# Altium footprint library LUMI_Handy_Soldering_LIB.PcbLib: 562 footprints (part 18 of 36)
Each footprint in its own frame and in the unit in brackets; x right, y up, seen from the top. Pads: shape width x height; smd on the part's side, far side on the other; paste and mask are expansions set on the pad; w line width, h text height; cw(c..) or ccw(c..) is an arc to the next point about the centre after c.
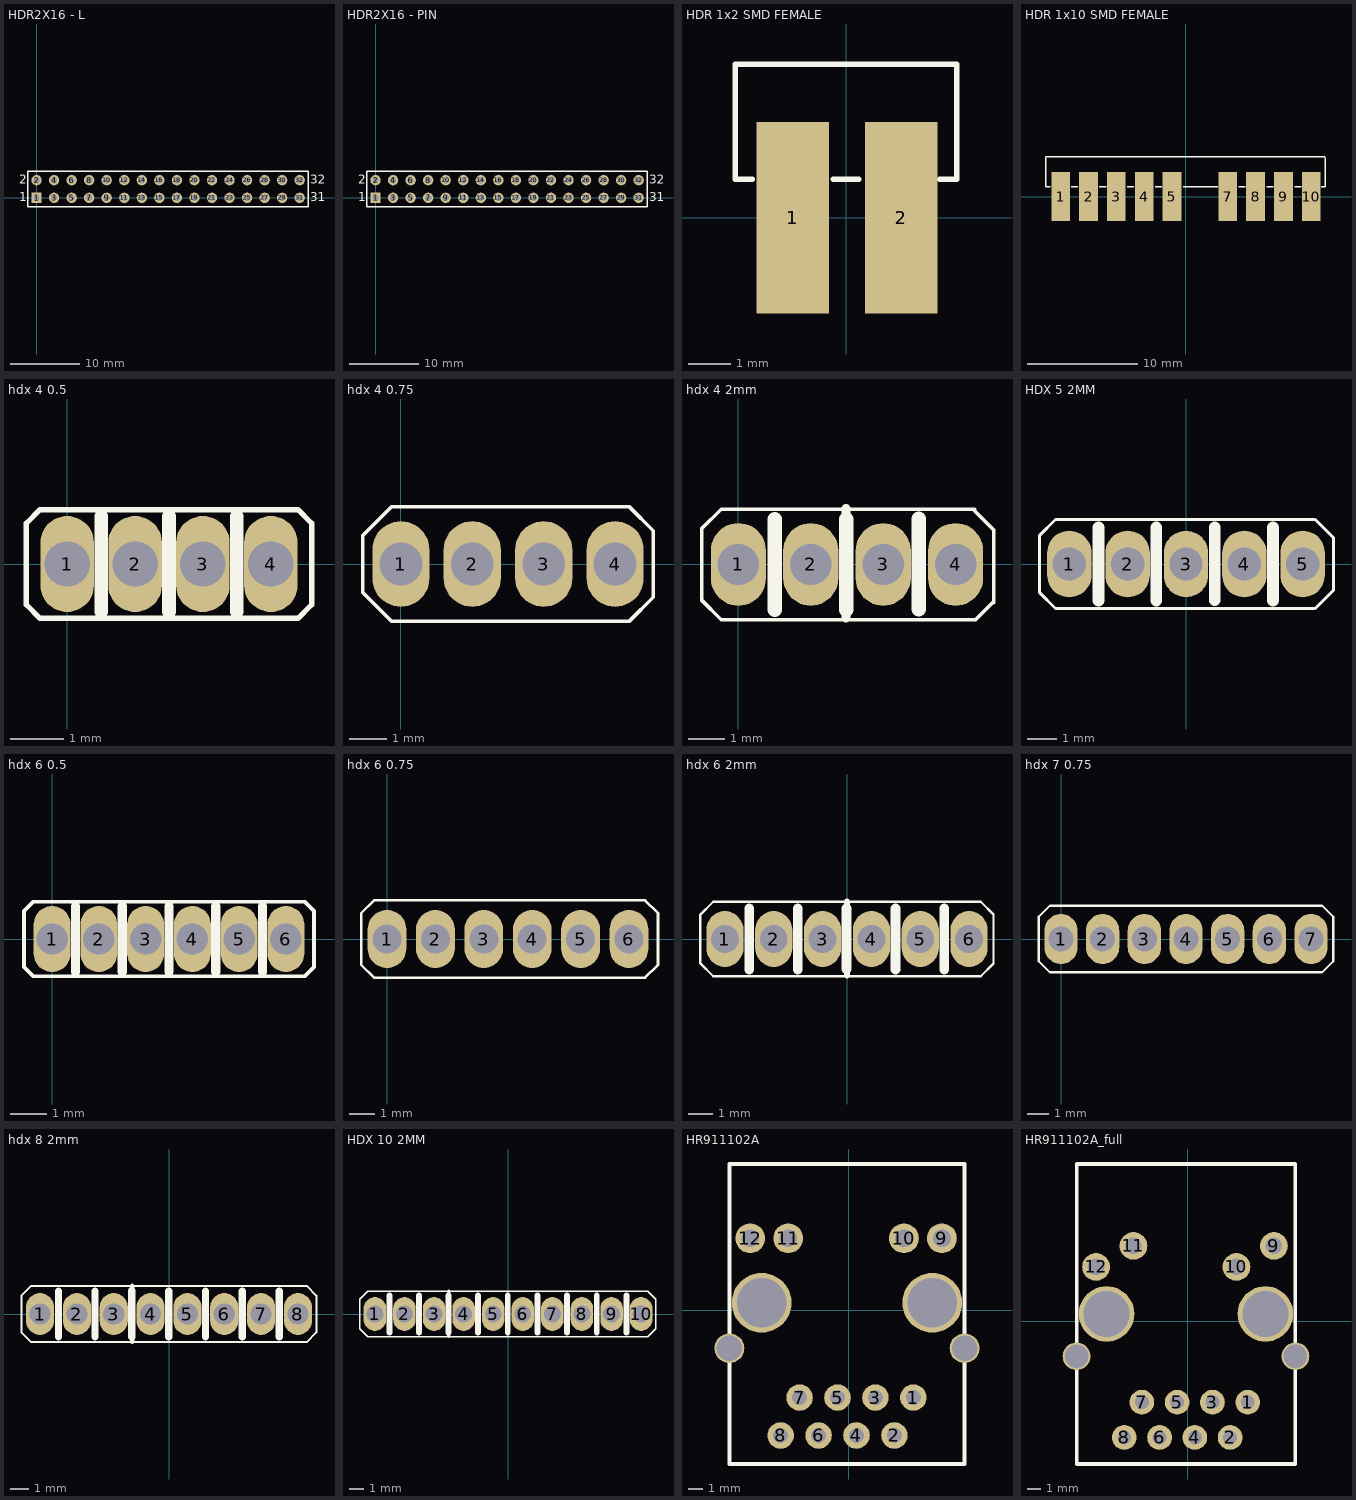
[diagram p17: the footprints below, top view; thin cyan lines are the x and y axes]

## HDR2X16 - L [mm] "Connector; Header; 16x2 Position"
pads (32):
  rect 1.5x1.5 hole 0.9: 1(0,0)
  round 1.5 hole 0.9: 2(0,2.54) 3(2.54,0) 4(2.54,2.54) 5(5.08,0) 6(5.08,2.54) 7(7.62,0) 8(7.62,2.54) 9(10.16,0) 10(10.16,2.54) 11(12.7,0) 12(12.7,2.54) 13(15.24,0) 14(15.24,2.54) 15(17.78,0) 16(17.78,2.54) 17(20.32,0) 18(20.32,2.54) 19(22.86,0) 20(22.86,2.54) 21(25.4,0) 22(25.4,2.54) 23(27.94,0) 24(27.94,2.54) 25(30.48,0) 26(30.48,2.54) 27(33.02,0) 28(33.02,2.54) 29(35.56,0) 30(35.56,2.54) 31(38.1,0) 32(38.1,2.54)
Top Overlay:
  lines w0.2: -1.27,-1.27 39.37,-1.27 39.37,3.81 -1.27,3.81 -1.27,-1.27
  text "2" at -2.54,2.032 h1.27
  text "1" at -2.54,-0.508 h1.27
  text "31" at 39.624,-0.508 h1.27
  text "32" at 39.624,2.032 h1.27
3D body: height 3.2, standoff -5.08, extent -1.118,-9.486 1.422,2.933
3D body: height 3.2, standoff -5.08, extent 1.372,-9.486 3.912,2.933
3D body: height 3.2, standoff -5.08, extent 3.912,-9.486 6.452,2.933
3D body: height 3.2, standoff -5.08, extent 6.452,-9.486 8.992,2.933
3D body: height 3.2, standoff -5.08, extent 8.992,-9.486 11.532,2.933
3D body: height 3.2, standoff -5.08, extent 11.506,-9.486 14.046,2.933
3D body: height 3.2, standoff -5.08, extent 14.021,-9.486 16.561,2.933
3D body: height 3.2, standoff -5.08, extent 16.561,-9.486 19.101,2.933
3D body: height 3.2, standoff -5.08, extent 19.101,-9.486 21.641,2.933
3D body: height 3.2, standoff -5.08, extent 21.615,-9.486 24.155,2.933
3D body: height 3.2, standoff -5.08, extent 24.155,-9.486 26.695,2.933
3D body: height 3.2, standoff -5.08, extent 26.695,-9.486 29.235,2.933
3D body: height 3.2, standoff -5.08, extent 29.185,-9.486 31.725,2.933
3D body: height 3.2, standoff -5.08, extent 31.674,-9.486 34.214,2.933
3D body: height 3.2, standoff -5.08, extent 34.163,-9.486 36.703,2.933
3D body: height 3.2, standoff -5.08, extent 36.678,-9.486 39.218,2.933

## HDR2X16 - PIN [mm] "Connector; Header; 16x2 Position"
pads (32):
  rect 1.5x1.5 hole 0.9: 1(0,0)
  round 1.5 hole 0.9: 2(0,2.54) 3(2.54,0) 4(2.54,2.54) 5(5.08,0) 6(5.08,2.54) 7(7.62,0) 8(7.62,2.54) 9(10.16,0) 10(10.16,2.54) 11(12.7,0) 12(12.7,2.54) 13(15.24,0) 14(15.24,2.54) 15(17.78,0) 16(17.78,2.54) 17(20.32,0) 18(20.32,2.54) 19(22.86,0) 20(22.86,2.54) 21(25.4,0) 22(25.4,2.54) 23(27.94,0) 24(27.94,2.54) 25(30.48,0) 26(30.48,2.54) 27(33.02,0) 28(33.02,2.54) 29(35.56,0) 30(35.56,2.54) 31(38.1,0) 32(38.1,2.54)
Top Overlay:
  lines w0.2: -1.27,-1.27 -1.27,3.81 39.37,3.81 39.37,-1.27 -1.27,-1.27
  text "32" at 39.624,2.032 h1.27
  text "31" at 39.624,-0.508 h1.27
  text "1" at -2.54,-0.508 h1.27
  text "2" at -2.54,2.032 h1.27
3D body: height 6.02, standoff -3.1, extent 36.805,-1.245 39.345,3.835
3D body: height 6.02, standoff -3.1, extent 34.265,-1.245 36.805,3.835
3D body: height 6.02, standoff -3.1, extent 31.725,-1.245 34.265,3.835
3D body: height 6.02, standoff -3.1, extent 29.185,-1.245 31.725,3.835
3D body: height 6.02, standoff -3.1, extent 26.721,-1.245 29.261,3.835
3D body: height 6.02, standoff -3.1, extent 24.206,-1.245 26.746,3.835
3D body: height 6.02, standoff -3.1, extent 21.692,-1.245 24.232,3.835
3D body: height 6.02, standoff -3.1, extent 19.202,-1.245 21.742,3.835
3D body: height 6.02, standoff -3.1, extent 16.662,-1.245 19.202,3.835
3D body: height 6.02, standoff -3.1, extent 14.122,-1.245 16.662,3.835
3D body: height 6.02, standoff -3.1, extent 11.582,-1.245 14.122,3.835
3D body: height 6.02, standoff -3.1, extent 9.042,-1.245 11.582,3.835
3D body: height 6.02, standoff -3.1, extent 6.502,-1.245 9.042,3.835
3D body: height 6.02, standoff -3.1, extent 3.962,-1.245 6.502,3.835
3D body: height 6.02, standoff -3.1, extent 1.422,-1.245 3.962,3.835
3D body: height 6.02, standoff -3.1, extent -1.118,-1.245 1.422,3.835

## HDR 1x2 SMD FEMALE [mm]
pads (2):
  rect 1.7x4.5 smd: 1(-1.25,0) 2(1.29,0)
Top Overlay:
  lines w0.127: -2.2,0.9 -2.6,0.9 -2.6,3.6 2.6,3.6 2.6,0.9 2.2,0.9 ; -0.3,0.9 0.3,0.9
3D body: height 6.02, standoff -3.1, extent -2.54,1 2.54,3.54

## HDR 1x10 SMD FEMALE [mm]
pads (9):
  rect 1.7x4.5 smd: 1(-11.41,0) 2(-8.87,0) 3(-6.35,0) 4(-3.81,0) 5(-1.27,0) 7(3.81,0) 8(6.35,0) 9(8.89,0) 10(11.43,0)
Top Overlay:
  lines w0.127: -12.36,0.9 -12.76,0.9 -12.76,3.623 12.633,3.623 12.719,3.537 12.719,0.889 12.319,0.889 ; -10.46,0.9 -9.86,0.9 ; -7.874,0.889 -7.274,0.889 ; -5.334,0.889 -4.734,0.889 ; -2.794,0.889 -2.194,0.889 ; -0.254,0.889 2.286,0.889 2.886,0.889 ; 4.826,0.889 5.426,0.889 ; 7.366,0.889 7.966,0.889 ; 9.906,0.889 10.506,0.889
3D body: height 6.02, standoff -3.1, extent -12.7,1 -7.62,3.54
3D body: height 6.02, standoff -3.1, extent -7.62,1 -2.54,3.54
3D body: height 6.02, standoff -3.1, extent -2.54,1 2.54,3.54
3D body: height 6.02, standoff -3.1, extent 2.54,1 7.62,3.54
3D body: height 6.02, standoff -3.1, extent 7.62,1 12.7,3.54

## hdx 4 0.5 [mm]
pads (4):
  oval 1x1.8 hole 0.85: 1(0,0) 2(1.27,0) 3(2.54,0) 4(3.81,0)
Top Overlay:
  lines w0.1: -0.762,-0.762 -0.508,-1.016 4.318,-1.016 4.572,-0.762 4.572,0.762 4.318,1.016 -0.508,1.016 -0.762,0.762 -0.762,-0.762
  lines w0.254: 0.635,-0.889 0.635,0.889 ; 1.905,-0.889 1.905,0.889 ; 3.175,-0.889 3.175,0.889

## hdx 4 0.75 [mil]
pads (4):
  oval 60x90 hole 45: 1(0,0) 2(75,0) 3(150,0) 4(225,0)
Top Overlay:
  lines w3.94: -40,-30 -40,30 -10,60 240,60 265,35 265,-35 240,-60 -10,-60 -40,-30

## hdx 4 2mm [mil]
pads (4):
  oval 60x90 hole 45: 1(0,0) 2(78.74,0) 3(157.48,0) 4(236.22,0)
Top Overlay:
  lines w3.94: -40,-38.74 -18.74,-60 257.87,-60 276.54,-41.34 277.56,-41.34 277.56,37.4 256.89,58.07 256.89,60 -18.74,60 -40,38.74 -40,-38.74
  lines w10: 117.13,-58.07 117.13,60.98
  lines w15.75: 39.37,-49.21 39.37,49.21 ; 117.48,-49.21 117.48,49.21 ; 196.22,-48.74 196.22,49.69

## HDX 5 2MM [mil]
pads (5):
  oval 60x90 hole 45: 1(-157.48,0) 2(-78.74,0) 3(0,0) 4(78.74,0) 5(157.48,0)
Top Overlay:
  lines w3.94: -197.48,-38.74 -176.22,-60 174.37,-60 199.37,-35 199.37,35 174.37,60 -176.22,60 -197.48,38.74 -197.48,-38.74
  lines w15.75: -118.11,-49.21 -118.11,49.21 ; -40,-49.21 -40,49.21 ; 38.74,-48.74 38.74,49.69 ; 117.48,-49.21 117.48,49.21

## hdx 6 0.5 [mm]
pads (6):
  oval 1x1.8 hole 0.85: 1(0,0) 2(1.27,0) 3(2.54,0) 4(3.81,0) 5(5.08,0) 6(6.35,0)
Top Overlay:
  lines w0.1: -0.762,-0.762 -0.508,-1.016 6.858,-1.016 7.112,-0.762 7.112,0.762 6.858,1.016 -0.508,1.016 -0.762,0.762 -0.762,-0.762
  lines w0.254: 0.635,-0.889 0.635,0.889 ; 1.905,-0.889 1.905,0.889 ; 3.175,-0.889 3.175,0.889 ; 4.445,-0.889 4.445,0.889 ; 5.715,-0.889 5.715,0.889

## hdx 6 0.75 [mil]
pads (6):
  oval 60x90 hole 45: 1(0,0) 2(75,0) 3(150,0) 4(225,0) 5(300,0) 6(375,0)
Top Overlay:
  lines w3.94: -40,-40 -40,40 -20,60 400,60 420,40 420,-40 400,-60 -20,-60 -40,-40

## hdx 6 2mm [mil]
pads (6):
  oval 60x90 hole 45: 1(-196.85,0) 2(-118.11,0) 3(-39.37,0) 4(39.37,0) 5(118.11,0) 6(196.85,0)
Top Overlay:
  lines w3.94: -236.85,-38.74 -236.85,38.74 -215.59,60 215.59,60 236.22,39.37 236.22,-39.37 215.59,-60 -215.59,-60 -236.85,-38.74
  lines w10: 0,-59.06 0,60
  lines w15.75: -157.48,-49.21 -157.48,49.21 ; -79.37,-49.21 -79.37,49.21 ; -0.63,-48.74 -0.63,49.69 ; 78.11,-49.21 78.11,49.21 ; 156.85,-49.21 156.85,49.21

## hdx 7 0.75 [mil]
pads (7):
  oval 60x90 hole 45: 1(0,0) 2(75,0) 3(150,0) 4(225,0) 5(300,0) 6(375,0) 7(450,0)
Top Overlay:
  lines w3.94: -40,-40 -40,40 -20,60 470,60 490,40 490,-40 470,-60 -20,-60 -40,-40

## hdx 8 2mm [mil]
pads (8):
  oval 60x90 hole 45: 1(-275.59,0) 2(-196.85,0) 3(-118.11,0) 4(-39.37,0) 5(39.37,0) 6(118.11,0) 7(196.85,0) 8(275.59,0)
Top Overlay:
  lines w3.94: -315.59,-38.74 -294.33,-60 294.33,-60 314.96,-39.37 314.96,39.37 294.33,60 -294.33,60 -315.59,38.74 -315.59,-38.74
  lines w10: -78.74,-59.06 -78.74,60
  lines w15.75: -236.22,-49.21 -236.22,49.21 ; -158.11,-49.21 -158.11,49.21 ; -79.37,-48.74 -79.37,49.69 ; -0.63,-49.21 -0.63,49.21 ; 78.11,-49.21 78.11,49.21 ; 156.85,-49.21 156.85,49.21 ; 235.59,-49.21 235.59,49.21

## HDX 10 2MM [mil]
pads (10):
  oval 60x90 hole 45: 1(-354.33,0) 2(-275.59,0) 3(-196.85,0) 4(-118.11,0) 5(-39.37,0) 6(39.37,0) 7(118.11,0) 8(196.85,0) 9(275.59,0) 10(354.33,0)
Top Overlay:
  lines w3.94: -394.33,-38.74 -373.07,-60 372.44,-60 393.7,-38.74 393.7,38.74 372.44,60 -373.07,60 -394.33,38.74 -394.33,-38.74
  lines w10: -157.48,-59.06 -157.48,60
  lines w15.75: -314.96,-49.21 -314.96,49.21 ; -236.85,-49.21 -236.85,49.21 ; -158.11,-48.74 -158.11,49.69 ; -79.37,-49.21 -79.37,49.21 ; -0.63,-49.21 -0.63,49.21 ; 78.11,-49.21 78.11,49.21 ; 156.85,-49.21 156.85,49.21 ; 236.22,-49.21 236.22,49.21 ; 314.96,-49.21 314.96,49.21

## HR911102A [mm] "Single Port RJ45 Connector with Integrated Magnetics and LED"
pads (16):
  round 1.778 hole 1: 1(4.317,-5.837) 2(3.047,-8.377) 3(1.777,-5.837) 4(0.507,-8.377) 5(-0.763,-5.837) 6(-2.033,-8.377) 7(-3.303,-5.837) 8(-4.573,-8.377)
  round 2 hole 1.2: 9(6.223,4.826) 10(3.683,4.826) 11(-4.064,4.826) 12(-6.604,4.826)
  round 2 hole 1.7: ""(-8.003,-2.537) ""(7.747,-2.537)
  round 4 hole 3.3: ""(-5.843,0.513) ""(5.587,0.513)
Top Overlay:
  lines w0.254: -8.003,-10.287 7.747,-10.287 7.747,9.8 -8.003,9.8 -8.003,-10.287
3D body: height 13.42, standoff -3.38, extent -8.3,-10 7.7,11.3

## HR911102A_full [mm] "Single Port RJ45 Connector with Integrated Magnetics and LED"
pads (16):
  round 1.778 hole 1: 1(4.317,-5.837) 2(3.047,-8.377) 3(1.777,-5.837) 4(0.507,-8.377) 5(-0.763,-5.837) 6(-2.033,-8.377) 7(-3.303,-5.837) 8(-4.573,-8.377)
  round 2 hole 1.2: 9(6.197,5.413) 10(3.5,3.9) 11(-3.913,5.413) 12(-6.6,3.9)
  round 2 hole 1.7: ""(-8.003,-2.537) ""(7.747,-2.537)
  round 4 hole 3.3: ""(-5.843,0.513) ""(5.587,0.513)
Top Overlay:
  lines w0.254: -8.003,-10.287 7.747,-10.287 7.747,11.303 -8.003,11.303 -8.003,-10.287
3D body: height 13.42, standoff -3.38, extent -8.3,-10 7.7,11.3